# Altium schematic symbol library 13-Analog D 数模模数.SchLib: 573 symbols (part 4 of 6) (continued)
## LMX2541
designator IC?
Ultra-Low Noise PLLatinum Frequency Synthesizer with Integrated VCO
pins: 1 GND (power), 2 VregRFout (power), 3 VccRFout (power), 4 L1, 5 Lmid, 6 L2, 7 VccVCO (power), 8 VregVCO (power), 9 VrefVCO, 10 GND (power), 11 CE (in), 12 ExtVCOin (in), 13 VccPLL1 (power), 14 VccCP1 (power), 15 Vtune (in), 16 CPout (out), 17 FLout (out), 18 VccCP2 (power), 19 VccPLL2 (power), 20 Ftest/LD (out), 21 OSCin (in), 22 ~{OSCin} (in), 23 VccOSCin (power), 24 RFoutEN (in), 25 VccFRAC (in), 26 VregFRAC (power), 27 GND (power), 28 VccDig (power), 29 VccBias (power), 30 Bypass, 31 VccDiv (power), 32 DATA (in), 33 CLK (in), 34 LE (in), 35 NC, 36 RFout (out), 37 EP (power)

## LT3748
designator IC?
100V Isolated Flyback Controller
pins: 1 VIN (in), 3 EN/UVLO (in), 5 INTVCC (in), 6 GATE (out), 7 SENSE (in), 8 GND (power), 9 GND (power), 10 SS (in), 11 VC (in), 12 TC (in), 14 RREF (in), 16 RFB (in)

## LT3751xFE
designator IC?
High Voltage Capacitor Charger Controller with Regulation
pins: 1 RVTRANS (in), 2 UVLO1 (in), 3 OVLO1 (in), 4 UVLO2 (in), 5 OVLO2 (in), 6 ~{FAULT} (oc), 7 ~{DONE} (oc), 8 CHARGE (in), 9 CLAMP (in), 10 FB (in), 11 CSN (in), 12 CSP (in), 13 VCC (power), 14 LVGATE (in), 15 HVGATE (out), 16 RBG (out), 17 NC, 18 RVOUT (in), 19 NC, 20 RDCM (in), 21 EP (in)

## LTC1144
designator IC?
Switched-Capacitor 15V Input to -18V to -2V Output, 50mA, Voltage Converter with Shutdown
pins: 1 BOOST (in), 2 CAP+, 3 GND (power), 4 CAP-, 5 VOUT (power), 6 ~{SHDN} (in), 7 OSC (in), 8 V+ (power)

## LTC1380
designator IC?
Single-Ended 8-Channel Analog Multiplexer with SMBus Interface
pins: 1 S0 (in), 2 S1 (in), 3 S2 (in), 4 S3 (in), 5 S4 (in), 6 S5 (in), 7 S6 (in), 8 S7 (in), 9 D0 (in), 10 VEE (power), 11 GND (power), 12 A1 (in), 13 A0 (in), 14 SDA (io), 15 SCL (in), 16 VCC (power)

## LTC1407
designator IC?
Serial 12-Bit, 3Msps Simultaneous Sampling ADC with Shutdown
pins: 1 CH0+ (in), 2 CH0- (in), 3 VREF, 4 CH1+ (in), 5 CH1- (in), 6 GND (power), 7 VDD (power), 8 SDO (out), 9 SCK (in), 10 CONV (in), 11 EP (power)

## LTC1409
designator IC?
12-Bit, 800ksps Sampling ADC with Shutdown
pins: 1 +AIN (in), 2 -AIN (in), 3 VREF (out), 4 REFCOMP (out), 5 AGND (power), 6 D11(MSB) (out), 7 D10 (out), 8 D9 (out), 9 D8 (out), 10 D7 (out), 11 D6 (out), 12 D5 (out), 13 D4 (out), 14 DGND (power), 15 D3 (out), 16 D2 (out), 17 D1 (out), 18 D0 (out), 19 OGND (power), 20 NAP/~{SLP} (in), 21 ~{SHDN} (in), 22 ~{RD} (in), 23 ~{CONVST} (in), 24 ~{CS} (in), 25 ~{BUSY} (out), 26 VSS (power), 27 OVDD (power), 28 AVDD (power)

## LTC1417
designator IC?
Low Power 14-Bit, 400ksps Sampling ADC Converter with Serial I/O
pins: 1 AIN+ (in), 2 AIN- (in), 3 VREF (out), 4 REFCOMP (out), 5 AGND (power), 6 EXTCLKIN (in), 7 SCLK (in), 8 CLKOUT (out), 9 DOUT (out), 10 DGND (power), 11 ~{SHDN} (in), 12 ~{RD} (in), 13 ~{CONVST} (in), 14 ~{BUSY} (out), 15 VSS (power), 16 VDD (power)

## LTC1595AIS8
designator IC?
Serial 16-Bit Multiplying DAC
pins: 1 VREF (in), 2 REFB (in), 3 OUT1 (out), 4 GND (power), 5 ~{LD} (in), 6 SRI (in), 7 CLK (in), 8 VDD (power)

## LTC1609ISW
designator IC?
16-Bit, 200ksps, Serial ADC With Multiple Input Ranges
pins: 1 R1IN (in), 2 AGND1 (power), 3 R2IN (in), 4 R3IN (in), 5 CAP (out), 6 REF (out), 7 AGND2 (power), 8 SB/~{BTC} (in), 9 EXT/~{INT} (in), 10 DGND (power), 11 SYNC (out), 12 DATACLK (io), 13 DATA (out), 14 TAG (out), 15 R/~{C} (in), 16 ~{CS} (in), 17 ~{BUSY} (out), 18 PWRD (in), 19 VANA (power), 20 VDIG (power)

## LTC1643AL
designator IC?
PCI-Bus Hot Swap Controller
pins: 1 12VIN (in), 2 VEEIN (power), 3 3VOUT (in), 4 TIMER (in), 5 ~{ON} (in), 6 ~{FAULT} (io), 7 ~{PWRGD} (out), 8 GND (power), 9 3VIN (in), 10 3VSENS (in), 11 GATE (out), 12 5VSENS (in), 13 5VIN (in), 14 5VOUT (in), 15 VEEOUT (out), 16 12VOUT (out)

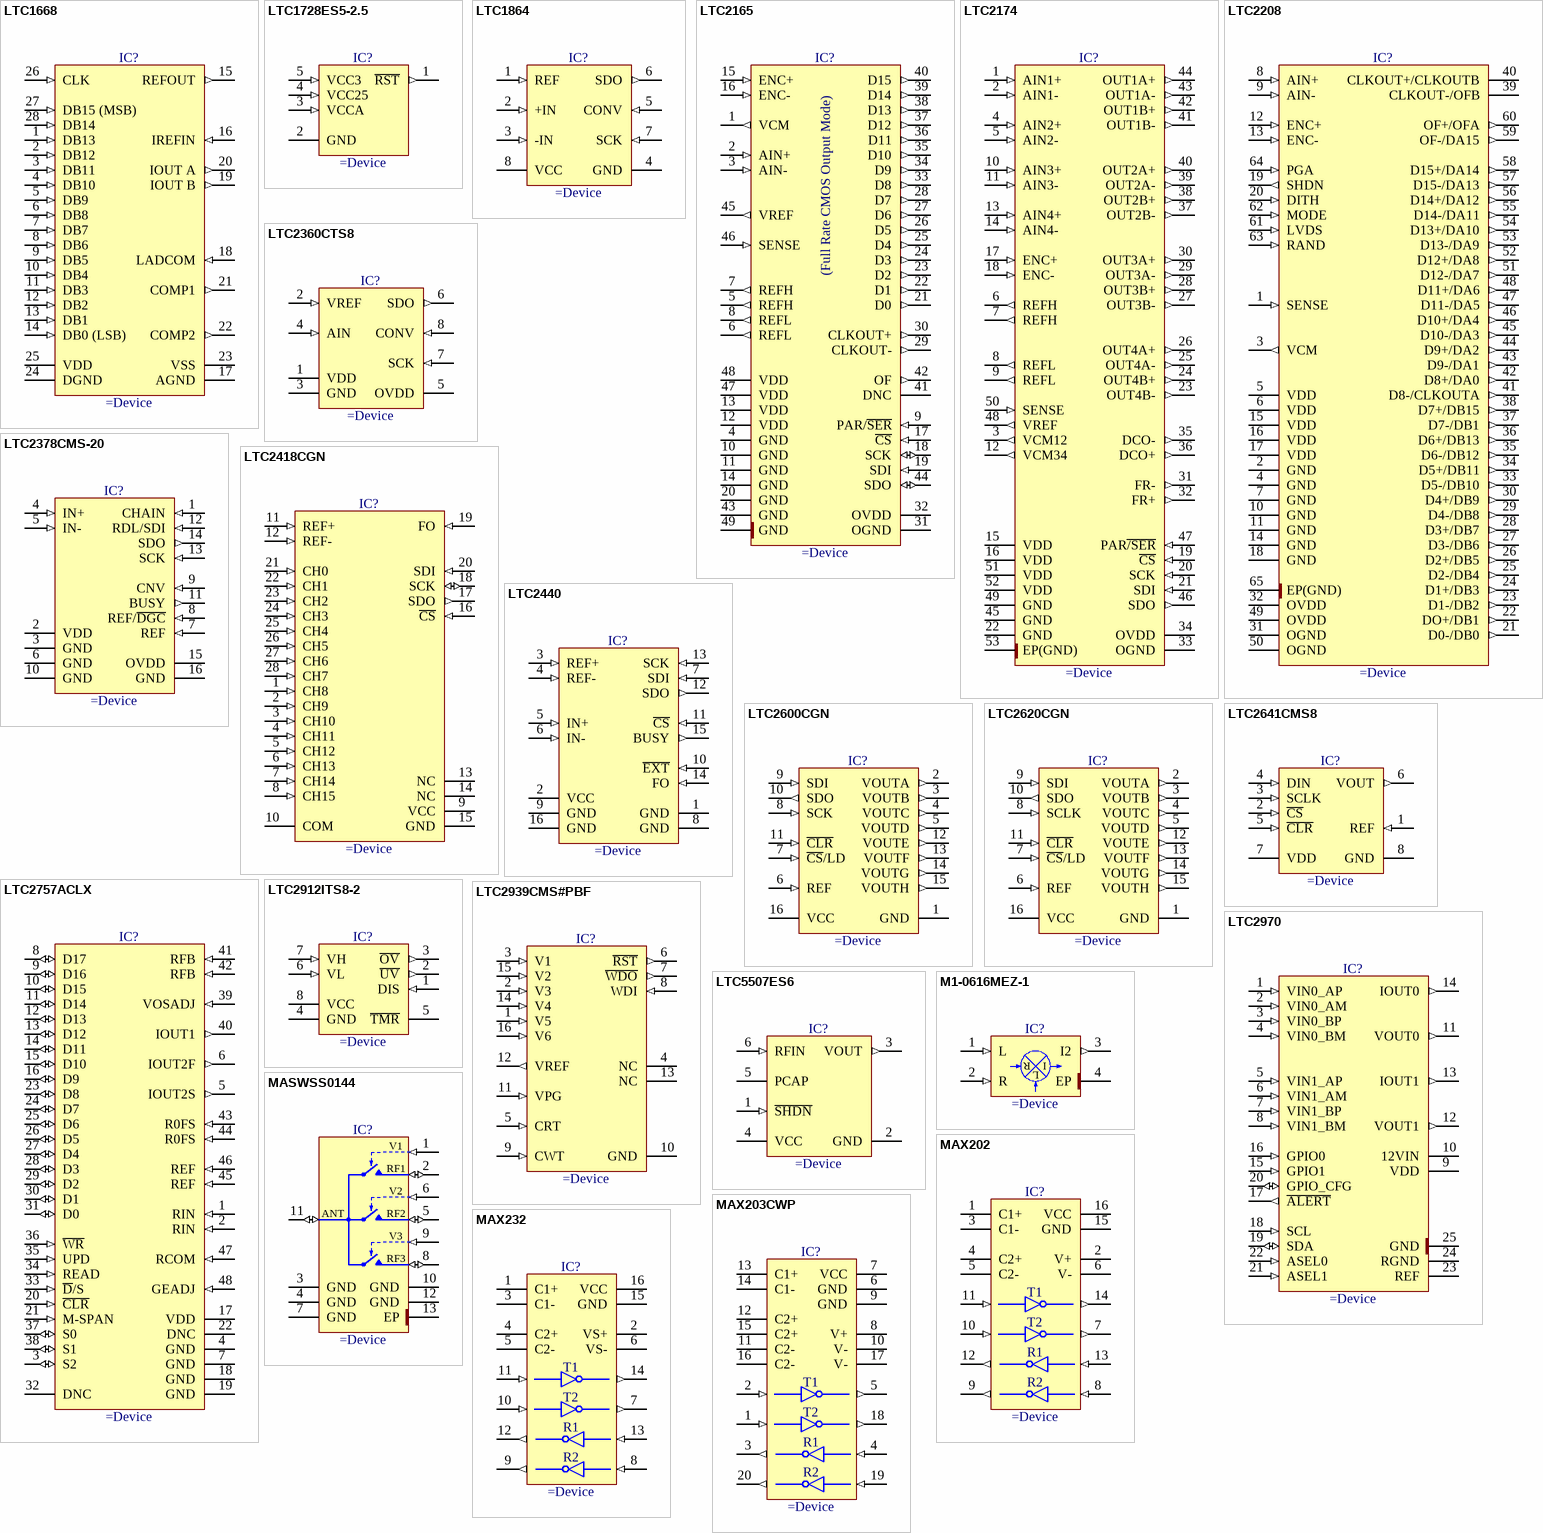
[diagram p24: symbols LTC1668 to MAX232]

## LTC1668
designator IC?
16-Bit, 50Msps Differential Current Output DAC
pins: 1 DB13 (in), 2 DB12 (in), 3 DB11 (in), 4 DB10 (in), 5 DB9 (in), 6 DB8 (in), 7 DB7 (in), 8 DB6 (in), 9 DB5 (in), 10 DB4 (in), 11 DB3 (in), 12 DB2 (in), 13 DB1 (in), 14 DB0 (LSB) (in), 15 REFOUT (out), 16 IREFIN (in), 17 AGND (power), 18 LADCOM (in), 19 IOUT B (out), 20 IOUT A (out), 21 COMP1 (out), 22 COMP2 (out), 23 VSS (power), 24 DGND (power), 25 VDD (power), 26 CLK (in), 27 DB15 (MSB) (in), 28 DB14 (in)

## LTC1728ES5-2.5
designator IC?
Micropower Precision (3.3V, 2.5V and Adjustable) Triple Supply Monitors In 5-Lead SOT-23 Packages
pins: 1 ~{RST} (out), 2 GND (power), 3 VCCA (in), 4 VCC25 (in), 5 VCC3 (in)

## LTC1864
designator IC?
uPower, 3V, 16-Bit, 150ksps Single Channel ADC
pins: 1 REF (in), 2 +IN (in), 3 -IN (in), 4 GND (power), 5 CONV (in), 6 SDO (out), 7 SCK (in), 8 VCC (power)

## LTC2165
designator IC?
16-Bit, 125Msps Low Power ADC (Full Rate CMOS Output Mode)
pins: 1 VCM (out), 2 AIN+ (in), 3 AIN- (in), 4 GND (power), 5 REFH (out), 6 REFL (out), 7 REFH (out), 8 REFL (out), 9 PAR/~{SER} (in), 10 GND (power), 11 GND (power), 12 VDD (power), 13 VDD (power), 14 GND (power), 15 ENC+ (in), 16 ENC- (in), 17 ~{CS} (in), 18 SCK (io), 19 SDI (in), 20 GND (power), 21 D0 (out), 22 D1 (out), 23 D2 (out), 24 D3 (out), 25 D4 (out), 26 D5 (out), 27 D6 (out), 28 D7 (out), 29 CLKOUT- (out), 30 CLKOUT+ (out), 31 OGND (power), 32 OVDD (power), 33 D8 (out), 34 D9 (out), 35 D10 (out), 36 D11 (out), 37 D12 (out), 38 D13 (out), 39 D14 (out), 40 D15 (out), 41 DNC, 42 OF (out), 43 GND (power), 44 SDO (io), 45 VREF (out), 46 SENSE (in), 47 VDD (power), 48 VDD (power), 49 GND (power)
2 alternate drawings of the same symbol
text: (Full Rate CMOS Output Mode)

## LTC2174
designator IC?
14-Bit, 105Msps Low Power Quad ADCs
pins: 1 AIN1+ (in), 2 AIN1- (in), 3 VCM12 (out), 4 AIN2+ (in), 5 AIN2- (in), 6 REFH (out), 7 REFH (out), 8 REFL (out), 9 REFL (out), 10 AIN3+ (in), 11 AIN3- (in), 12 VCM34 (out), 13 AIN4+ (in), 14 AIN4- (in), 15 VDD (power), 16 VDD (power), 17 ENC+ (in), 18 ENC- (in), 19 ~{CS} (in), 20 SCK (in), 21 SDI (in), 22 GND (power), 23 OUT4B- (out), 24 OUT4B+ (out), 25 OUT4A- (out), 26 OUT4A+ (out), 27 OUT3B- (out), 28 OUT3B+ (out), 29 OUT3A- (out), 30 OUT3A+ (out), 31 FR- (out), 32 FR+ (out), 33 OGND (power), 34 OVDD (power), 35 DCO- (out), 36 DCO+ (out), 37 OUT2B- (out), 38 OUT2B+ (out), 39 OUT2A- (out), 40 OUT2A+ (out), 41 OUT1B- (out), 42 OUT1B+ (out), 43 OUT1A- (out), 44 OUT1A+ (out), 45 GND (power), 46 SDO (out), 47 PAR~{/SER} (in), 48 VREF (out), 49 GND (power), 50 SENSE (in), 51 VDD (power), 52 VDD (power), 53 EP(GND) (power)

## LTC2208
designator IC?
16-Bit, 130Msps ADC
pins: 1 SENSE (in), 2 GND (power), 3 VCM (out), 4 GND (power), 5 VDD (power), 6 VDD (power), 7 GND (power), 8 AIN+ (in), 9 AIN- (in), 10 GND (power), 11 GND (power), 12 ENC+ (in), 13 ENC- (in), 14 GND (power), 15 VDD (power), 16 VDD (power), 17 VDD (power), 18 GND (power), 19 SHDN (out), 20 DITH (in), 21 D0-/DB0 (out), 22 DO+/DB1 (out), 23 D1-/DB2 (out), 24 D1+/DB3 (out), 25 D2-/DB4 (out), 26 D2+/DB5 (out), 27 D3-/DB6 (out), 28 D3+/DB7 (out), 29 D4-/DB8 (out), 30 D4+/DB9 (out), 31 OGND (power), 32 OVDD (power), 33 D5-/DB10 (out), 34 D5+/DB11 (out), 35 D6-/DB12 (out), 36 D6+/DB13 (out), 37 D7-/DB1 (out), 38 D7+/DB15 (out), 39 CLKOUT-/OFB (power), 40 CLKOUT+/CLKOUTB (power), 41 D8-/CLKOUTA (out), 42 D8+/DA0 (out), 43 D9-/DA1 (out), 44 D9+/DA2 (out), 45 D10-/DA3 (out), 46 D10+/DA4 (out), 47 D11-/DA5 (out), 48 D11+/DA6 (out), 49 OVDD (power), 50 OGND (power), 51 D12-/DA7 (out), 52 D12+/DA8 (out), 53 D13-/DA9 (out), 54 D13+/DA10 (out), 55 D14-/DA11 (out), 56 D14+/DA12 (out), 57 D15-/DA13 (out), 58 D15+/DA14 (out), 59 OF-/DA15 (out), 60 OF+/OFA (out), 61 LVDS (in), 62 MODE (in), 63 RAND (in), 64 PGA (in), 65 EP(GND) (power)

## LTC2360CTS8
designator IC?
100ksps, 12-Bit Serial ADC
pins: 1 VDD (power), 2 VREF (in), 3 GND (power), 4 AIN (in), 5 OVDD (power), 6 SDO (out), 7 SCK (in), 8 CONV (in)

## LTC2378CMS-20
designator IC?
20-Bit, 1Msps, Low Power SAR ADC with 0.5ppm INL
pins: 1 CHAIN (in), 2 VDD (power), 3 GND (power), 4 IN+ (in), 5 IN- (in), 6 GND (power), 7 REF (in), 8 REF/~{DGC} (in), 9 CNV (in), 10 GND (power), 11 BUSY (out), 12 RDL/SDI (in), 13 SCK (in), 14 SDO (out), 15 OVDD (power), 16 GND (power)

## LTC2418CGN
designator IC?
16-Channel 24-Bit No Latency Delta Sigma ADC
pins: 1 CH8 (in), 2 CH9 (in), 3 CH10 (in), 4 CH11 (in), 5 CH12 (in), 6 CH13 (in), 7 CH14 (in), 8 CH15 (in), 9 VCC (power), 10 COM (power), 11 REF+ (in), 12 REF- (in), 13 NC, 14 NC, 15 GND (power), 16 ~{CS} (in), 17 SDO (out), 18 SCK (io), 19 FO (in), 20 SDI (in), 21 CH0 (in), 22 CH1 (in), 23 CH2 (in), 24 CH3 (in), 25 CH4 (in), 26 CH5 (in), 27 CH6 (in), 28 CH7 (in)

## LTC2440
designator IC?
24-Bit High Speed Differential Delta Sigma ADC with Selectable Speed/Resolution
pins: 1 GND (power), 2 VCC (power), 3 REF+ (in), 4 REF- (in), 5 IN+ (in), 6 IN- (in), 7 SDI (in), 8 GND (power), 9 GND (power), 10 ~{EXT} (in), 11 ~{CS} (in), 12 SDO (out), 13 SCK (in), 14 FO (in), 15 BUSY (out), 16 GND (power)

## LTC2600CGN
designator IC?
Octal 16-Bit Rail-to-Rail DAC
pins: 1 GND (power), 2 VOUTA (out), 3 VOUTB (out), 4 VOUTC (out), 5 VOUTD (out), 6 REF (in), 7 ~{CS}/LD (in), 8 SCK (in), 9 SDI (in), 10 SDO (out), 11 ~{CLR} (in), 12 VOUTE (out), 13 VOUTF (out), 14 VOUTG (out), 15 VOUTH (out), 16 VCC (power)

## LTC2620CGN
designator IC?
Octal 12-Bit Rail-to-Rail DAC
pins: 1 GND (power), 2 VOUTA (out), 3 VOUTB (out), 4 VOUTC (out), 5 VOUTD (out), 6 REF (in), 7 ~{CS}/LD (in), 8 SCLK (in), 9 SDI (in), 10 SDO (out), 11 ~{CLR} (in), 12 VOUTE (out), 13 VOUTF (out), 14 VOUTG (out), 15 VOUTH (out), 16 VCC (power)

## LTC2641CMS8
designator IC?
16-Bit Voltage Output DAC
pins: 1 REF (in), 2 ~{CS} (in), 3 SCLK (in), 4 DIN (in), 5 ~{CLR} (in), 6 VOUT (out), 7 VDD (power), 8 GND (power)

## LTC2757ACLX
designator IC?
18-Bit SoftSpan IOUT DAC with Parallel I/O
pins: 1 RIN (in), 2 RIN (in), 3 S2 (io), 4 GND (power), 5 IOUT2S (out), 6 IOUT2F (out), 7 GND (power), 8 D17 (io), 9 D16 (io), 10 D15 (io), 11 D14 (io), 12 D13 (io), 13 D12 (io), 14 D11 (io), 15 D10 (io), 16 D9 (io), 17 VDD (power), 18 GND (power), 19 GND (power), 20 ~{CLR} (in), 21 M-SPAN (in), 22 DNC, 23 D8 (io), 24 D7 (io), 25 D6 (io), 26 D5 (io), 27 D4 (io), 28 D3 (io), 29 D2 (io), 30 D1 (io), 31 D0 (io), 32 DNC, 33 ~{D}/S (in), 34 READ (in), 35 UPD (in), 36 ~{WR} (in), 37 S0 (io), 38 S1 (io), 39 VOSADJ (in), 40 IOUT1 (out), 41 RFB (in), 42 RFB (in), 43 R0FS (in), 44 R0FS (in), 45 REF (in), 46 REF (in), 47 RCOM (in), 48 GEADJ (in)
2 alternate drawings of the same symbol

## LTC2912ITS8-2
designator IC?
Single UV/OV Voltage Monitor
pins: 1 DIS (in), 2 ~{UV} (out), 3 ~{OV} (out), 4 GND (power), 5 ~{TMR}, 6 VL (in), 7 VH (in), 8 VCC (power)

## LTC2939CMS#PBF
designator IC?
Configurable 4- and 6-Supply Monitors with Watchdog Timer
pins: 1 V5 (in), 2 V3 (in), 3 V1 (in), 4 NC, 5 CRT (in), 6 ~{RST} (out), 7 ~{WDO} (out), 8 WDI (in), 9 CWT (in), 10 GND (power), 11 VPG (in), 12 VREF (out), 13 NC, 14 V4 (in), 15 V2 (in), 16 V6 (in)

## LTC2970
designator IC?
Dual I2C Power Supply Monitor and Margining Controller
pins: 1 VIN0_AP (in), 2 VIN0_AM (in), 3 VIN0_BP (in), 4 VIN0_BM (in), 5 VIN1_AP (in), 6 VIN1_AM (in), 7 VIN1_BP (in), 8 VIN1_BM (in), 9 VDD (power), 10 12VIN (power), 11 VOUT0 (out), 12 VOUT1 (out), 13 IOUT1 (out), 14 IOUT0 (out), 15 GPIO1 (in), 16 GPIO0 (in), 17 ~{ALERT} (out), 18 SCL (in), 19 SDA (io), 20 GPIO_CFG (io), 21 ASEL1 (in), 22 ASEL0 (in), 23 REF, 24 RGND (power), 25 GND (power)

## LTC5507ES6
designator IC?
100kHz to 1GHz RF Power Detector
pins: 1 ~{SHDN} (in), 2 GND (power), 3 VOUT (out), 4 VCC (power), 5 PCAP, 6 RFIN (in)

## M1-0616MEZ-1
designator IC?
Double-Balanced Frequency Mixer - LO/RF 6.0 to 16.0 GHz, IF DC to 4.0 GHz
pins: 1 L (in), 2 R (in), 3 I2 (out), 4 EP (power)
text: I

## MASWSS0144
designator IC?
2.7V GaAs SP3T Switch, DC - 3.0 GHz
pins: 1 V1 (in), 2 RF1 (io), 3 GND (power), 4 GND (power), 5 RF2 (io), 6 V2 (in), 7 GND (power), 8 RF3 (io), 9 V3 (in), 10 GND (power), 11 ANT (io), 12 GND (power), 13 EP (power)

## MAX202
designator IC?
+5V, RS-232 Transceivers with 0.1uF External Capacitors
pins: 1 C1+, 2 V+ (power), 3 C1-, 4 C2+, 5 C2-, 6 V- (power), 7 T2OUT (out), 8 R2IN (in), 9 R2OUT (out), 10 T2IN (in), 11 T1IN (in), 12 R1OUT (out), 13 R1IN (in), 14 T1OUT (out), 15 GND (power), 16 VCC (power)
text: T1; T2; R1; R2

## MAX203CWP
designator IC?
+5V, Dual Line RS-232 Transceivers
pins: 1 T2IN (in), 2 T1IN (in), 3 R1OUT (out), 4 R1IN (in), 5 T1OUT (out), 6 GND (power), 7 VCC (power), 8 V+ (power), 9 GND (power), 10 V- (power), 11 C2-, 12 C2+, 13 C1+, 14 C1-, 15 C2+, 16 C2-, 17 V- (power), 18 T2OUT (out), 19 R2IN (in), 20 R2OUT (out)
text: T1; T2; R1; R2

## MAX232
designator IC?
Dual RS232 Driver/Reveiver
pins: 1 C1+, 2 VS+ (power), 3 C1-, 4 C2+, 5 C2-, 6 VS- (power), 7 T2OUT (out), 8 R2IN (in), 9 R2OUT (out), 10 T2IN (in), 11 T1IN (in), 12 R1OUT (out), 13 R1IN (in), 14 T1OUT (out), 15 GND (power), 16 VCC (power)
text: T1; T2; R1; R2

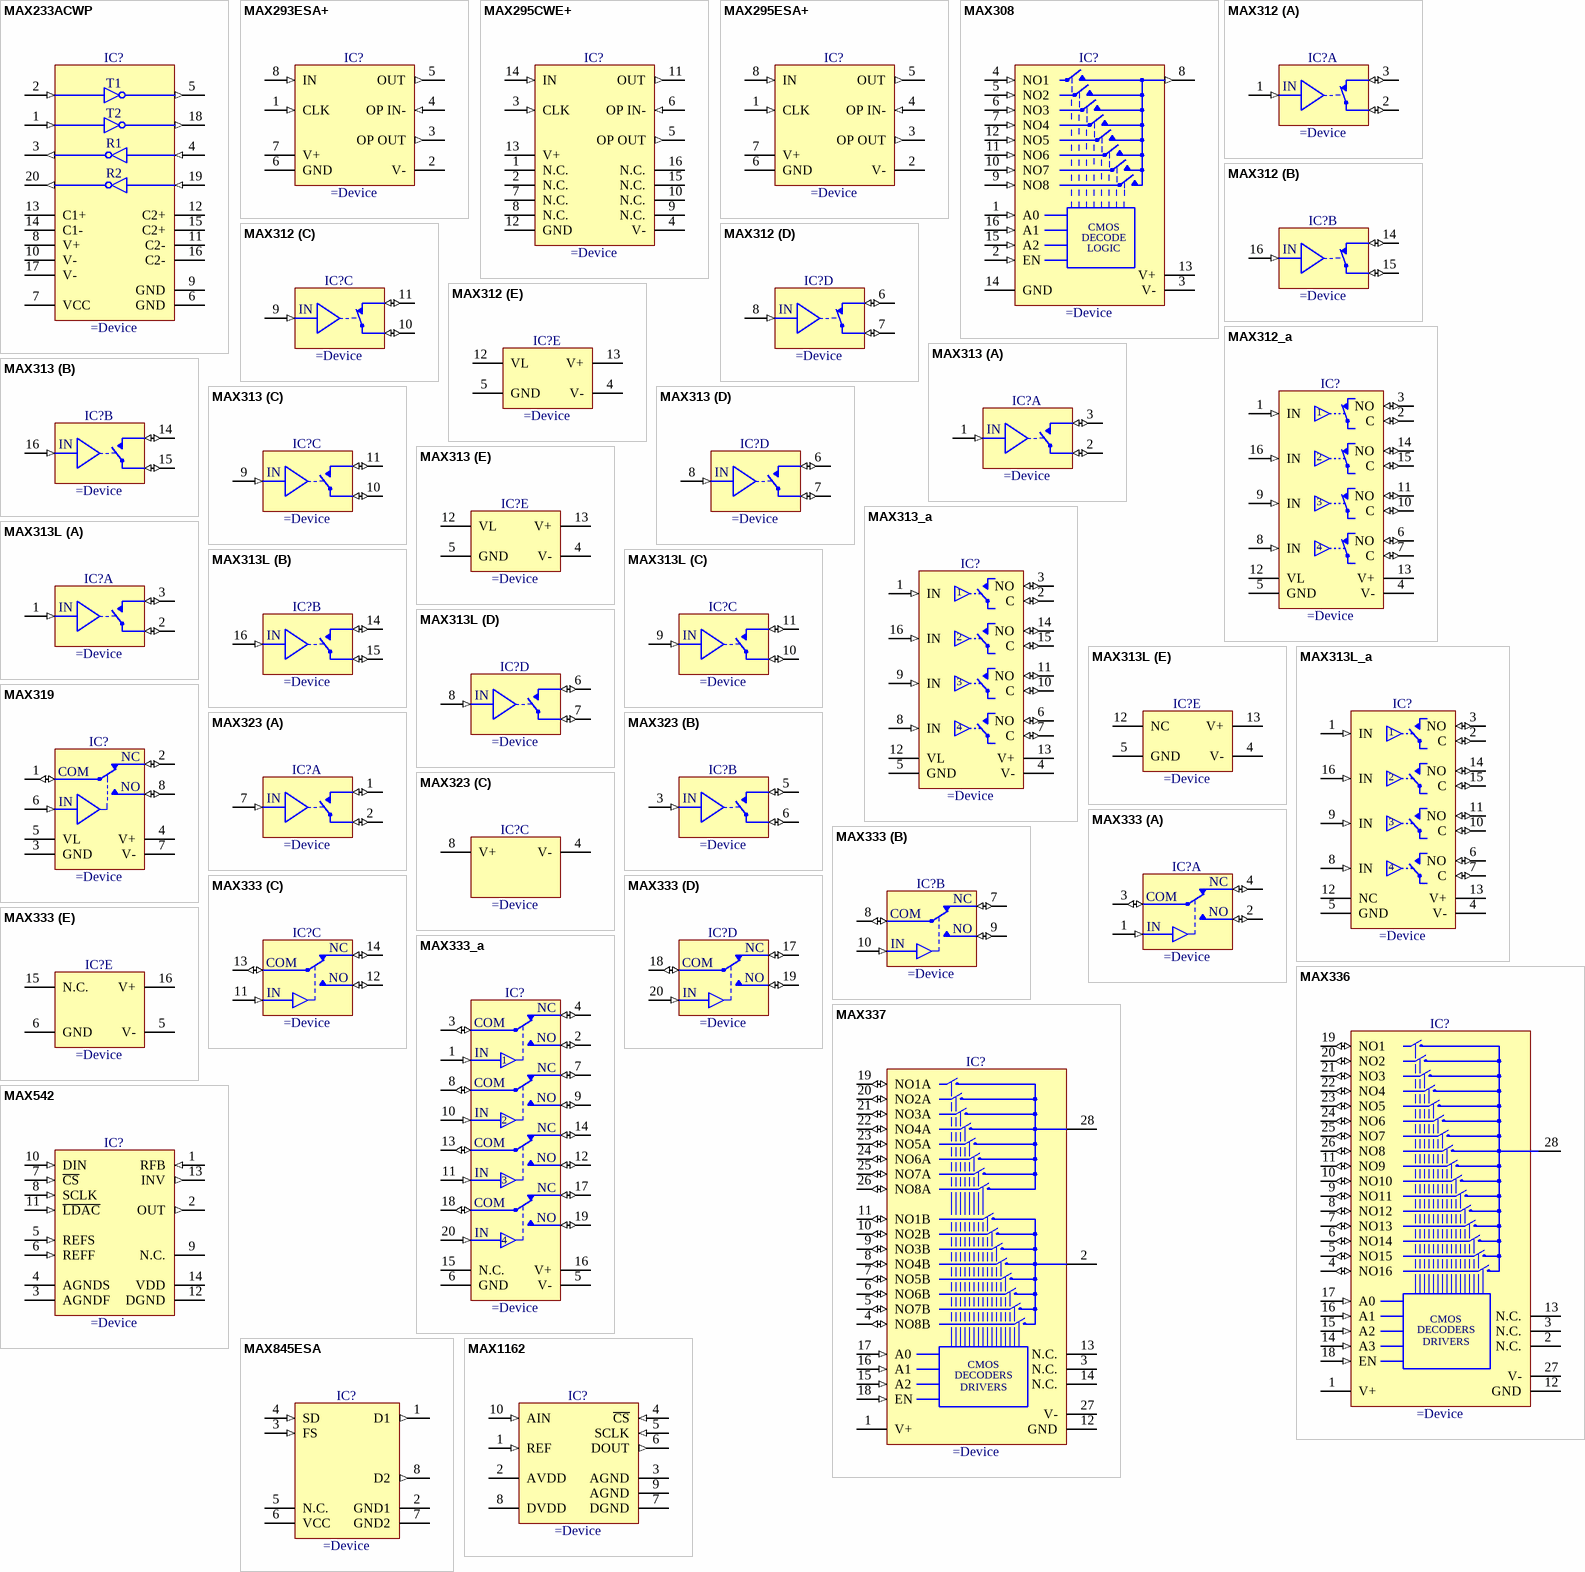
[diagram p25: symbols MAX233ACWP to MAX1162]

## MAX233ACWP
designator IC?
Dual RS232 Driver/Reveiver (No External Caps, High Slew Rate)
pins: 1 T2IN (in), 2 T1IN (in), 3 R1OUT (out), 4 R1IN (in), 5 T1OUT (out), 6 GND (power), 7 VCC (power), 8 V+ (power), 9 GND (power), 10 V- (power), 11 C2-, 12 C2+, 13 C1+, 14 C1-, 15 C2+, 16 C2-, 17 V- (power), 18 T2OUT (out), 19 R2IN (in), 20 R2OUT (out)
text: T1; T2; R1; R2

## MAX293ESA+
designator IC?
8th-Order, Lowpass, Elliptic Switched-Capacitor Filter
pins: 1 CLK (in), 2 V- (power), 3 OP OUT (out), 4 OP IN- (in), 5 OUT (out), 6 GND (power), 7 V+ (power), 8 IN (in)

## MAX295CWE+
designator IC?
8th-Order, Lowpass, Switched-Capacitor Filter
pins: 1 N.C., 2 N.C., 3 CLK (in), 4 V- (power), 5 OP OUT (out), 6 OP IN- (in), 7 N.C., 8 N.C., 9 N.C., 10 N.C., 11 OUT (out), 12 GND (power), 13 V+ (power), 14 IN (in), 15 N.C., 16 N.C.

## MAX295ESA+
designator IC?
8th-Order, Lowpass, Switched-Capacitor Filter
pins: 1 CLK (in), 2 V- (power), 3 OP OUT (out), 4 OP IN- (in), 5 OUT (out), 6 GND (power), 7 V+ (power), 8 IN (in)

## MAX308
designator IC?
Precision, 8-Channel, High-Performance, CMOS Analog Multiplexer
pins: 1 A0 (in), 2 EN (in), 3 V- (power), 4 NO1 (in), 5 NO2 (in), 6 NO3 (in), 7 NO4 (in), 8 COM (out), 9 NO8 (in), 10 NO7 (in), 11 NO6 (in), 12 NO5 (in), 13 V+ (power), 14 GND (power), 15 A2 (in), 16 A1 (in)
text: CMOS; DECODE; LOGIC

## MAX312
designator IC?
10 Ohms Quad, SPST, CMOS Analog Switches (Normally Closed)
part A pins: 1 IN (in), 2 COM (io), 3 NO (io)
part B pins: 14 NO (io), 15 COM (io), 16 IN (in)
part C pins: 9 IN (in), 10 COM (io), 11 NO (io)
part D pins: 6 NO (io), 7 COM (io), 8 IN (in)
part E pins: 4 V- (power), 5 GND (power), 12 VL (power), 13 V+ (power)

## MAX312_a
designator IC?
10 Ohms Quad, SPST, CMOS Analog Switches (Normally Closed)
pins: 1 IN (in), 2 C (io), 3 NO (io), 4 V- (power), 5 GND (power), 6 NO (io), 7 C (io), 8 IN (in), 9 IN (in), 10 C (io), 11 NO (io), 12 VL (power), 13 V+ (power), 14 NO (io), 15 C (io), 16 IN (in)

## MAX313
designator IC?
10 Ohms Quad, SPST, CMOS Analog Switches (Normally Open)
part A pins: 1 IN (in), 2 COM (io), 3 NO (io)
part B pins: 14 NO (io), 15 COM (io), 16 IN (in)
part C pins: 9 IN (in), 10 COM (io), 11 NO (io)
part D pins: 6 NO (io), 7 COM (io), 8 IN (in)
part E pins: 4 V- (power), 5 GND (power), 12 VL (power), 13 V+ (power)

## MAX313_a
designator IC?
10 Ohms Quad, SPST, CMOS Analog Switches (Normally Open)
pins: 1 IN (in), 2 C (io), 3 NO (io), 4 V- (power), 5 GND (power), 6 NO (io), 7 C (io), 8 IN (in), 9 IN (in), 10 C (io), 11 NO (io), 12 VL (power), 13 V+ (power), 14 NO (io), 15 C (io), 16 IN (in)

## MAX313L
designator IC?
10 Ohms Quad, SPST, +3V Logic-Compatible Analog Switches (Normally Open)
part A pins: 1 IN (in), 2 COM (io), 3 NO (io)
part B pins: 14 NO (io), 15 COM (io), 16 IN (in)
part C pins: 9 IN (in), 10 COM (io), 11 NO (io)
part D pins: 6 NO (io), 7 COM (io), 8 IN (in)
part E pins: 4 V- (power), 5 GND (power), 12 NC, 13 V+ (power)

## MAX313L_a
designator IC?
10 Ohms Quad, SPST, +3V Logic-Compatible Analog Switches (Normally Open)
pins: 1 IN (in), 2 C (io), 3 NO (io), 4 V- (power), 5 GND (power), 6 NO (io), 7 C (io), 8 IN (in), 9 IN (in), 10 C (io), 11 NO (io), 12 NC, 13 V+ (power), 14 NO (io), 15 C (io), 16 IN (in)

## MAX319
designator IC?
Precision, Single SPDT CMOS Analog Switch
pins: 1 S (io), 2 NC (io), 3 GND (power), 4 V+ (power), 5 VL (power), 6 IN (in), 7 V- (power), 8 NO (io)
text: COM

## MAX323
designator IC?
Precision, Single-Supply, Dual SPST Analog Switches (Normally Open)
part A pins: 1 NO (io), 2 COM (io), 7 IN (in)
part B pins: 3 IN (in), 5 NO (io), 6 COM (io)
part C pins: 4 V- (power), 8 V+ (power)

## MAX333
designator IC?
Quad SPDT CMOS Analog Switch
part A pins: 1 IN (in), 2 NO (io), 3 COM (io), 4 NC (io)
part B pins: 7 NC (io), 8 COM (io), 9 NO (io), 10 IN (in)
part C pins: 11 IN (in), 12 NO (io), 13 COM (io), 14 NC (io)
part D pins: 17 NC (io), 18 COM (io), 19 NO (io), 20 IN (in)
part E pins: 5 V- (power), 6 GND (power), 15 N.C., 16 V+ (power)

## MAX333_a
designator IC?
Quad SPDT CMOS Analog Switch
pins: 1 IN1 (in), 2 NO1 (io), 3 COM1 (io), 4 NC1 (io), 5 V- (power), 6 GND (power), 7 NC2 (io), 8 COM2 (io), 9 NO2 (io), 10 IN2 (in), 11 IN3 (in), 12 NO3 (io), 13 COM3 (io), 14 NC3 (io), 15 N.C., 16 V+ (power), 17 NC4 (io), 18 COM4 (io), 19 NO4 (io), 20 IN4 (in)
text: NC; COM; NO; IN

## MAX336
designator IC?
16-Channel, Low-Leakage, CMOS Analog Multiplexers
pins: 1 V+ (power), 2 N.C., 3 N.C., 4 NO16 (io), 5 NO15 (io), 6 NO14 (io), 7 NO13 (io), 8 NO12 (io), 9 NO11 (io), 10 NO10 (io), 11 NO9 (io), 12 GND (power), 13 N.C., 14 A3 (in), 15 A2 (in), 16 A1 (in), 17 A0 (in), 18 EN (in), 19 NO1 (io), 20 NO2 (io), 21 NO3 (io), 22 NO4 (io), 23 NO5 (io), 24 NO6 (io), 25 NO7 (io), 26 NO8 (io), 27 V- (power), 28 COM (power)
text: CMOS; DECODERS; DRIVERS

## MAX337
designator IC?
Dual 8-Channel, Low-Leakage, CMOS Analog Multiplexers
pins: 1 V+ (power), 2 COMB, 3 N.C., 4 NO8B (io), 5 NO7B (io), 6 NO6B (io), 7 NO5B (io), 8 NO4B (io), 9 NO3B (io), 10 NO2B (io), 11 NO1B (io), 12 GND (power), 13 N.C., 14 N.C., 15 A2 (in), 16 A1 (in), 17 A0 (in), 18 EN (in), 19 NO1A (io), 20 NO2A (io), 21 NO3A (io), 22 NO4A (io), 23 NO5A (io), 24 NO6A (io), 25 NO7A (io), 26 NO8A (io), 27 V- (power), 28 COMA (power)
text: CMOS; DECODERS; DRIVERS

## MAX542
designator IC?
+5V, Serial-Input, Voltage-Output, 16-Bit ±1LSB DAC
pins: 1 RFB (in), 2 OUT (out), 3 AGNDF (power), 4 AGNDS (power), 5 REFS (in), 6 REFF (in), 7 ~{CS} (in), 8 SCLK (in), 9 N.C., 10 DIN (in), 11 ~{LDAC} (in), 12 DGND (power), 13 INV (out), 14 VDD (power)

## MAX845ESA
designator IC?
Isolated Transformer Driver for PCMCIA Applications
pins: 1 D1 (out) "Voltage Reference", 2 GND1 (power) "Non-Inverting Input", 3 FS (in) "Ground", 4 SD (in) "Ground", 5 N.C. "Chip Select Bar", 6 VCC (power) "Inverting Input", 7 GND2 (power) "Serial Data Output", 8 D2 (out) "Serial Clock"

## MAX1162
designator IC?
16-Bit, +5V, 200ksps ADC with 10uA Shutdown
pins: 1 REF (in) "External Reference Voltage Input", 2 AVDD (power) "Analog +5V Supply Voltage.", 3 AGND (power) "Analog Ground", 4 ~{CS} (in) "Active-Low Chip-Select Input", 5 SCLK (in) "Serial Clock Input", 6 DOUT (out) "Serial Data Output", 7 DGND (power) "Digital Ground", 8 DVDD (power) "Digital Supply Voltage.", 9 AGND (power) "Analog Ground.", 10 AIN (in) "Analog Input"
